# Altium footprint library General.PCBLIB: 226 footprints (part 5 of 15)
Each footprint in its own frame and in the unit in brackets; x right, y up, seen from the top. Pads: shape width x height; smd on the part's side, far side on the other; paste and mask are expansions set on the pad; w line width, h text height; cw(c..) or ccw(c..) is an arc to the next point about the centre after c.
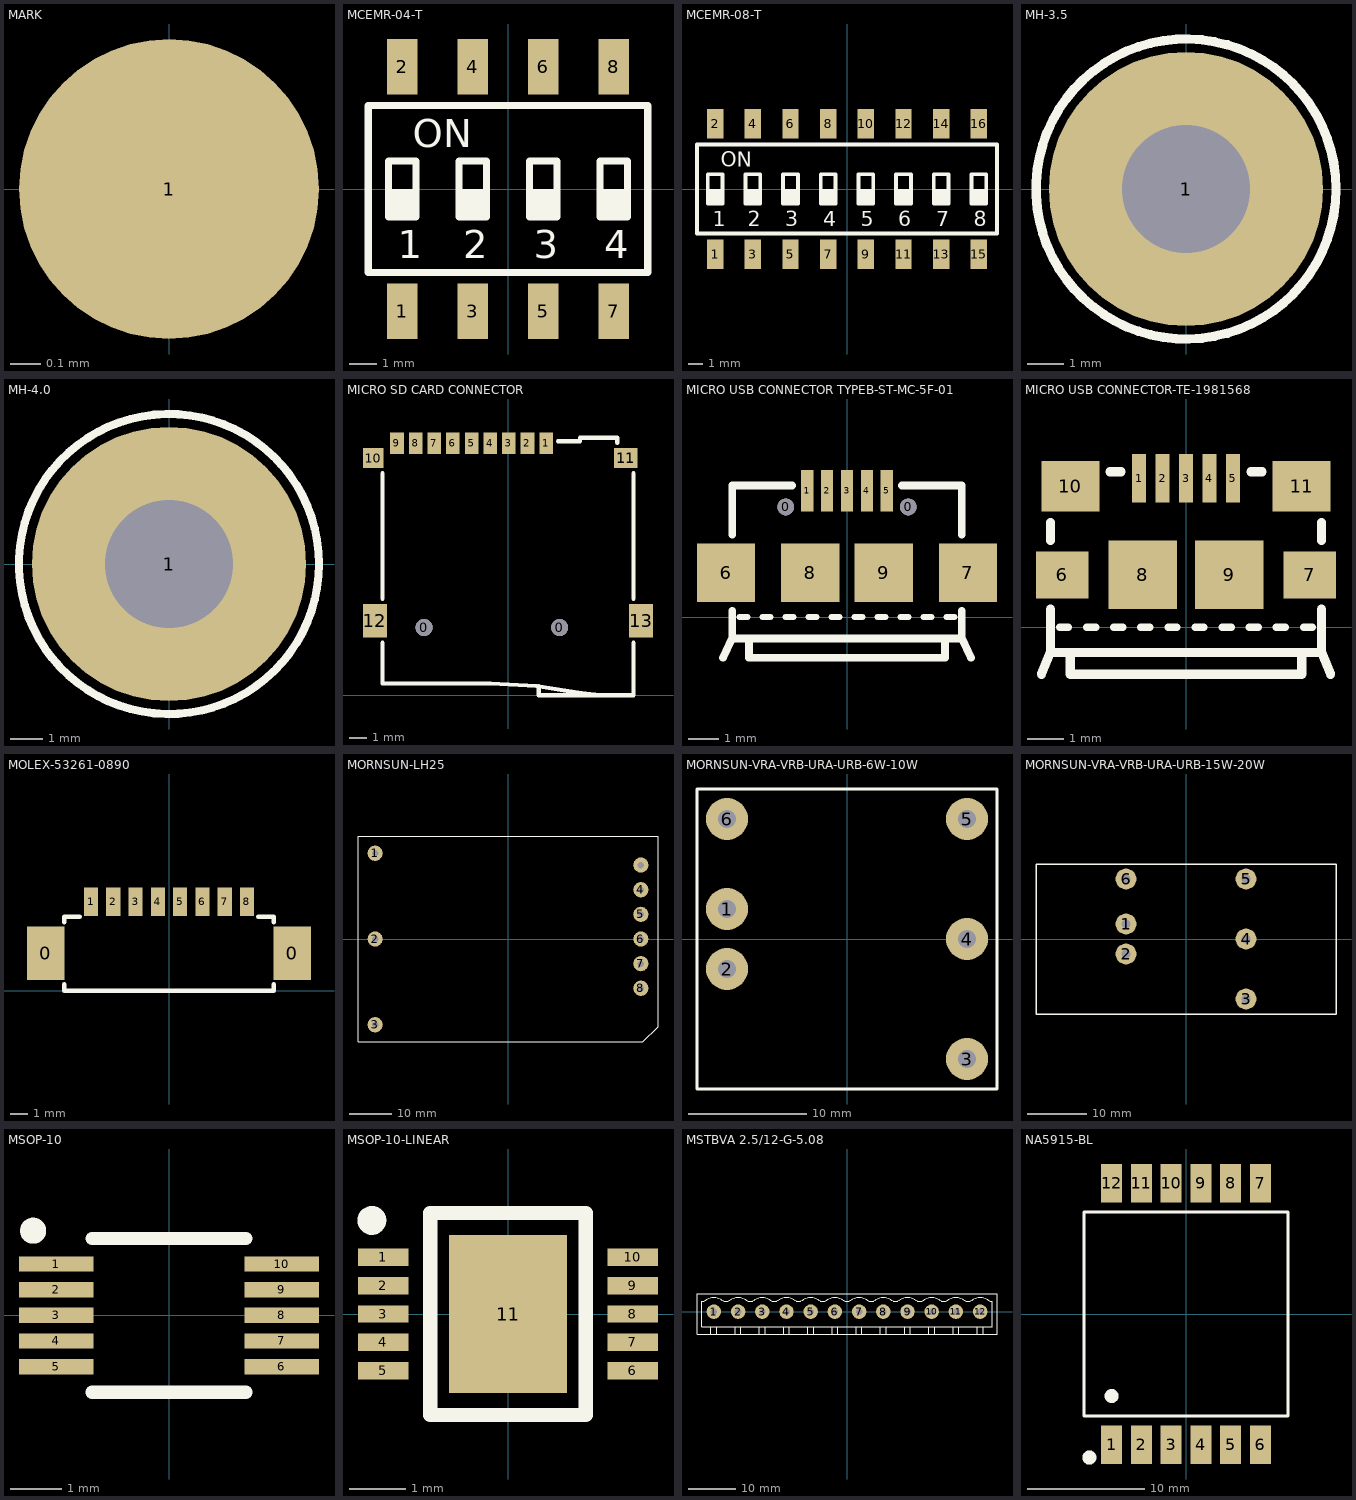
[diagram p4: the footprints below, top view; thin cyan lines are the x and y axes]

## MARK [mm] "Mark"
pads (1):
  round 1 smd mask+0.75: 1(0,0)

## MCEMR-04-T [mm] "DIP SWITCH"
height 3.8
pads (8):
  rect 1.1x2 smd: 1(-3.81,-4.4) 2(-3.81,4.4) 3(-1.27,-4.4) 4(-1.27,4.4) 5(1.27,-4.4) 6(1.27,4.4) 7(3.81,-4.4) 8(3.81,4.4)
Top Overlay:
  rectangle: 3.31,-1 4.31,0
  rectangle: 0.77,-1 1.77,0
  rectangle: -1.77,-1 -0.77,0
  rectangle: -4.31,-1 -3.31,0
  lines w0.254: -5.03,-3 -5.03,3 5.03,3 5.03,-3 -5.03,-3 ; -4.31,-1 -3.31,-1 -3.31,1 -4.31,1 -4.31,-1 ; -1.77,-1 -0.77,-1 -0.77,1 -1.77,1 -1.77,-1 ; 0.77,-1 1.77,-1 1.77,1 0.77,1 0.77,-1 ; 3.31,-1 4.31,-1 4.31,1 3.31,1 3.31,-1
  text "1" at -3.975,-2.5 h1.02
  text "2" at -1.613,-2.5 h1.02
  text "4" at 3.467,-2.5 h1.02
  text "3" at 0.927,-2.5 h1.02
  text "ON" at -3.42,1.5 h1.02
3D body: height 4.9, standoff 0, extent -5.55,-4.9 5.55,4.9

## MCEMR-08-T [mm] "DIP SWITCH"
height 3.8
pads (16):
  rect 1.1x2 smd: 1(-8.89,-4.4) 2(-8.89,4.4) 3(-6.35,-4.4) 4(-6.35,4.4) 5(-3.81,-4.4) 6(-3.81,4.4) 7(-1.27,-4.4) 8(-1.27,4.4) 9(1.27,-4.4) 10(1.27,4.4) 11(3.81,-4.4) 12(3.81,4.4) 13(6.35,-4.4) 14(6.35,4.4) 15(8.89,-4.4) 16(8.89,4.4)
Top Overlay:
  rectangle: 8.39,-1 9.39,0
  rectangle: 5.85,-1 6.85,0
  rectangle: 3.31,-1 4.31,0
  rectangle: 0.77,-1 1.77,0
  rectangle: -1.77,-1 -0.77,0
  rectangle: -4.31,-1 -3.31,0
  rectangle: -6.85,-1 -5.85,0
  rectangle: -9.39,-1 -8.39,0
  lines w0.254: -10.11,-3 -10.11,3 10.11,3 10.11,-3 -10.11,-3 ; -9.39,-1 -8.39,-1 -8.39,1 -9.39,1 -9.39,-1 ; -6.85,-1 -6.85,1 -5.85,1 -5.85,-1 -6.85,-1 ; -4.31,-1 -3.31,-1 -3.31,1 -4.31,1 -4.31,-1 ; -1.77,-1 -0.77,-1 -0.77,1 -1.77,1 -1.77,-1 ; 0.77,-1 1.77,-1 1.77,1 0.77,1 0.77,-1 ; 3.31,-1 4.31,-1 4.31,1 3.31,1 3.31,-1 ; 5.85,-1 6.85,-1 6.85,1 5.85,1 5.85,-1 ; 8.39,-1 9.39,-1 9.39,1 8.39,1 8.39,-1
  text "ON" at -8.5,1.5 h1.02
  text "8" at 8.547,-2.5 h1.02
  text "7" at 6.007,-2.5 h1.02
  text "6" at 3.467,-2.5 h1.02
  text "5" at 0.927,-2.5 h1.02
  text "4" at -1.613,-2.5 h1.02
  text "3" at -4.153,-2.5 h1.02
  text "2" at -6.693,-2.5 h1.02
  text "1" at -9.055,-2.5 h1.02
3D body: height 4.24, standoff -0.01, extent -10.18,-4.955 10.184,4.955

## MH-3.5 [mm] "Mounting Hole"
pads (1):
  round 7.5 hole 3.5: 1(0,0)
Top Overlay:
  circle w0.254: c0,0 r4.1

## MH-4.0 [mm] "Mounting Hole"
pads (1):
  round 8.6 hole 4: 1(0,0)
Top Overlay:
  circle w0.254: c0,0 r4.7

## MICRO SD CARD CONNECTOR [mm] "Micro SD Card Connector"
height 1.8
pads (15):
  round 1 hole 1 unplated: 0(-4.95,4) 0(3.05,4)
  rect 0.8x1.27 smd: 1(2.25,14.865) 2(1.15,14.865) 3(0.05,14.865) 4(-1.05,14.865) 5(-2.15,14.865) 6(-3.25,14.865) 7(-4.35,14.865) 8(-5.45,14.865) 9(-6.55,14.865)
  rect 1.2x1.2 smd: 10(-7.95,14)
  rect 1.4x1.2 smd: 11(6.95,14)
  rect 1.4x2 smd: 12(-7.85,4.4) 13(7.85,4.4)
Top Overlay:
  lines w0.254: -7.4,3.1 -7.4,0.7 -1.02,0.7 1.68,0.55 4.34,0.12 5.42,0 ; -7.4,5.7 -7.4,13.1 ; 1.82,0.53 1.82,0 7.4,0 7.4,3.1 ; 2.95,15 4.25,15 4.25,15.2 6.45,15.2 6.45,14.9 ; 7.4,5.7 7.4,13.1
3D body: height 1.92, standoff -0.52, extent -8.05,0 7.95,15.25

## MICRO USB CONNECTOR TYPEB-ST-MC-5F-01 [mm] "Micro USB Connector, Type B, ST-MC-5F-01"
height 2.35
pads (11):
  round 0.55 hole 0.55 unplated: 0(-2,3.6) 0(2,3.6)
  rect 0.4x1.35 smd: 1(-1.3,4.125) 2(-0.65,4.125) 3(0,4.125) 4(0.65,4.125) 5(1.3,4.125)
  rect 1.9x1.9 smd: 6(-3.95,1.45) 7(3.95,1.45) 8(-1.2,1.45) 9(1.2,1.45)
Top Overlay:
  lines w0.203: -3.5,0 -3.25,0 ; -2.75,0 -2.5,0 ; -2,0 -1.75,0 ; -1.25,0 -1,0 ; -0.5,0 -0.25,0 ; 0.25,0 0.5,0 ; 1,0 1.25,0 ; 1.75,0 2,0 ; 2.5,0 2.75,0 ; 3.25,0 3.5,0
  lines w0.254: -4.05,-1.33 -3.75,-0.7 ; -3.75,0.2 -3.75,0 -3.75,-0.7 ; -3.75,2.7 -3.75,4.3 -1.8,4.3 ; -3.2,-0.7 -3.2,-1.33 3.2,-1.33 3.2,-0.7 ; 1.8,4.3 3.75,4.3 3.75,2.7 ; 3.75,0.2 3.75,0 3.75,-0.7 ; 4.05,-1.33 3.75,-0.7 ; -3.75,-0.7 3.75,-0.7
3D body: height 2.72, standoff -0.22, extent -3.99,-1.13 3.99,4.3

## MICRO USB CONNECTOR-TE-1981568 [mm] "Micro USB Connector, TE, 1981568"
height 2.51
pads (11):
  rect 0.4x1.35 smd: 1(-1.3,4.125) 2(-0.65,4.125) 3(0,4.125) 4(0.65,4.125) 5(1.3,4.125)
  rect 1.45x1.3 smd: 6(-3.425,1.45) 7(3.425,1.45)
  rect 1.9x1.9 smd: 8(-1.2,1.45) 9(1.2,1.45)
  rect 1.6x1.4 smd: 10(-3.2,3.9) 11(3.2,3.9)
Top Overlay:
  lines w0.203: -3.5,0 -3.25,0 ; -2.75,0 -2.5,0 ; -2,0 -1.75,0 ; -1.25,0 -1,0 ; -0.5,0 -0.25,0 ; 0.25,0 0.5,0 ; 1,0 1.25,0 ; 1.75,0 2,0 ; 2.5,0 2.75,0 ; 3.25,0 3.5,0
  lines w0.254: -4,-1.3 -3.75,-0.7 ; -3.75,0.5 -3.75,0 -3.75,-0.7 ; -3.75,2.4 -3.75,2.9 ; -3.2,-0.7 -3.2,-1.3 3.2,-1.3 3.2,-0.7 ; -2.1,4.3 -1.8,4.3 ; 1.8,4.3 2.1,4.3 ; 3.75,0.5 3.75,0 3.75,-0.7 ; 3.75,2.4 3.75,2.9 ; 4,-1.3 3.75,-0.7 ; -3.75,-0.7 3.75,-0.7
3D body: height 2.72, standoff -0.22, extent -3.99,-1.13 3.99,4.3

## MOLEX-53261-0890 [mm] "1.25mm Connector, Molex, 53261-0890"
height 3.4
pads (10):
  rect 2.1x3 smd: 0(-6.925,2.1) 0(6.925,2.1)
  rect 0.8x1.6 smd: 1(-4.375,5) 2(-3.125,5) 3(-1.875,5) 4(-0.625,5) 5(0.625,5) 6(1.875,5) 7(3.125,5) 8(4.375,5)
Top Overlay:
  lines w0.254: -5.875,0.35 -5.875,0 5.875,0 5.875,0.35 ; -5.875,3.85 -5.875,4.15 -5,4.15 ; 5,4.15 5.875,4.15 5.875,3.85
3D body: height 3.4, standoff 0, extent -7.575,0 7.575,5.2

## MORNSUN-LH25 [mm] "AC-DC"
height 23.5
pads (9):
  round 3.556 hole 1.5: 1(-31,20) 2(-31,0) 3(-31,-20) 4(31,11.5) 5(31,5.75) 6(31,0) 7(31,-5.75) 8(31,-11.5) Trim(31,17.25)
Top Overlay:
  lines w0.254: -35,-24 -35,24 35,24 35,-20.5 31.5,-24 -35,-24
3D body: height 23.5, standoff 0, extent -35,-24 35,24

## MORNSUN-VRA-VRB-URA-URB-6W-10W [mil] "DC-DC"
height 460.63
pads (6):
  round 140 hole 59.06: 1(-400,100) 2(-400,-100) 3(400,-400) 4(400,0) 5(400,400) 6(-400,400)
Top Overlay:
  lines w10: -500,-500 500,-500 500,500 -500,500 -500,-500
3D body: height 460.63, standoff 0, extent -500,-500 500,500

## MORNSUN-VRA-VRB-URA-URB-15W-20W [mil] "DC-DC"
height 464.57
pads (6):
  round 140 hole 59.06: 1(-400,100) 2(-400,-100) 3(400,-400) 4(400,0) 5(400,400) 6(-400,400)
Top Overlay:
  lines w10: -1000,-500 -1000,500 1000,500 1000,-500 -1000,-500
3D body: height 464.57, standoff 0, extent -1000,-500 1000,500

## MSOP-10 [mm] "MSOP, 10PIN"
height 1.1
pads (10):
  rect 1.45x0.3 smd: 1(-2.2,1) 2(-2.2,0.5) 3(-2.2,0) 4(-2.2,-0.5) 5(-2.2,-1) 6(2.2,-1) 7(2.2,-0.5) 8(2.2,0) 9(2.2,0.5) 10(2.2,1)
Top Overlay:
  circle w0.254: c-2.65,1.65 r0.127
  lines w0.254: -1.5,-1.5 1.5,-1.5 ; -1.5,1.5 1.5,1.5
3D body: height 1.1, standoff 0, extent -2.45,-1.5 2.45,1.5

## MSOP-10-LINEAR [mil] "MSOP, 10PIN, LINEAR"
height 43.31
pads (11):
  rect 35x12 smd: 1(-86.61,39.37) 2(-86.61,19.68) 3(-86.61,0) 4(-86.61,-19.68) 5(-86.61,-39.37) 6(86.61,-39.37) 7(86.61,-19.68) 8(86.61,0) 9(86.61,19.68) 10(86.61,39.37)
  rect 82x110 smd paste-18.5: 11(0,0)
Top Overlay:
  circle w10: c-94.49,64.96 r5
  lines w10: -53.94,-70.08 53.94,-70.08 53.94,70.08 -53.94,70.08 -53.94,-70.08
3D body: height 43.28, standoff -0.03, extent -96.46,-59.06 96.46,59.06

## MSTBVA 2.5/12-G-5.08 [mil] "Socket, PHOENIX CONTACT"
height 472.44
pads (12):
  round 120 hole 55.12: 1(-1100,0) 2(-900,0) 3(-700,0) 4(-500,0) 5(-300,0) 6(-100,0) 7(100,0) 8(300,0) 9(500,0) 10(700,0) 11(900,0) 12(1100,0)
Top Overlay:
  lines w10: -1123.82,-188.98 -1123.82,-124.54 ; -1076.18,-188.98 -1076.18,-124.54 ; -923.82,-188.98 -923.82,-124.54 ; -876.18,-188.98 -876.18,-124.54 ; -723.82,-188.98 -723.82,-124.54 ; -676.18,-188.98 -676.18,-124.54 ; -523.82,-188.98 -523.82,-124.54 ; -476.18,-188.98 -476.18,-124.54 ; -323.82,-188.98 -323.82,-124.54 ; -276.18,-188.98 -276.18,-124.54 ; -123.82,-188.98 -123.82,-124.54 ; -76.18,-188.98 -76.18,-124.54 ; 76.18,-188.98 76.18,-124.54 ; 123.82,-188.98 123.82,-124.54 ; 276.18,-188.98 276.18,-124.54 ; 323.82,-188.98 323.82,-124.54 ; 476.18,-188.98 476.18,-124.54 ; 523.82,-188.98 523.82,-124.54 ; 676.18,-188.98 676.18,-124.54 ; 723.82,-188.98 723.82,-124.54 ; 876.18,-188.98 876.18,-124.54 ; 923.82,-188.98 923.82,-124.54 ; 1076.18,-188.98 1076.18,-124.54 ; 1123.82,-188.98 1123.82,-124.54 ; -1239.37,-188.98 -1239.37,149.61 1239.37,149.61 1239.37,-188.98 -1239.37,-188.98 ; -1200,-124.54 -1200,83.86 -1180.3,83.86 cw(c-1100,-2.76) -1019.7,83.86 -980.3,83.86 cw(c-900,-2.76) -819.7,83.86 -780.3,83.86 cw(c-700,-2.76) -619.7,83.86 -580.3,83.86 cw(c-500,-2.76) -419.7,83.86 -380.3,83.86 cw(c-300,-2.76) -219.7,83.86 -180.3,83.86 cw(c-100,-2.76) -19.7,83.86 19.7,83.86 cw(c100,-2.76) 180.3,83.86 219.7,83.86 cw(c300,-2.76) 380.3,83.86 419.7,83.86 cw(c500,-2.76) 580.3,83.86 619.7,83.86 cw(c700,-2.76) 780.3,83.86 819.7,83.86 cw(c900,-2.76) 980.3,83.86 1019.7,83.86 cw(c1100,-2.76) 1180.3,83.86 1200,83.86 1200,-124.54 -1200,-124.54
3D body: height 472.44, standoff -153.54, extent -1239.37,-188.98 1239.37,149.61

## NA5915-BL [mm] "Transformer, Coilcraft, NA5915-BL"
height 10
pads (12):
  rect 1.79x3.3 smd: 1(-6.35,-11.15) 2(-3.81,-11.15) 3(-1.27,-11.15) 4(1.27,-11.15) 5(3.81,-11.15) 6(6.35,-11.15) 7(6.35,11.15) 8(3.81,11.15) 9(1.27,11.15) 10(-1.27,11.15) 11(-3.81,11.15) 12(-6.35,11.15)
Top Overlay:
  circle w0.7: c-6.35,-7 r0.25
  circle w0.7: c-8.25,-12.25 r0.25
  lines w0.254: -8.7,-8.7 8.7,-8.7 8.7,8.7 -8.7,8.7 -8.7,-8.7
3D body: height 8.3, standoff 0, extent -8.75,-11.05 8.75,11.05